# Altium footprint library connectors.PcbLib: 256 footprints (part 5 of 16)
Each footprint in its own frame and in the unit in brackets; x right, y up, seen from the top. Pads: shape width x height; smd on the part's side, far side on the other; paste and mask are expansions set on the pad; w line width, h text height; cw(c..) or ccw(c..) is an arc to the next point about the centre after c.
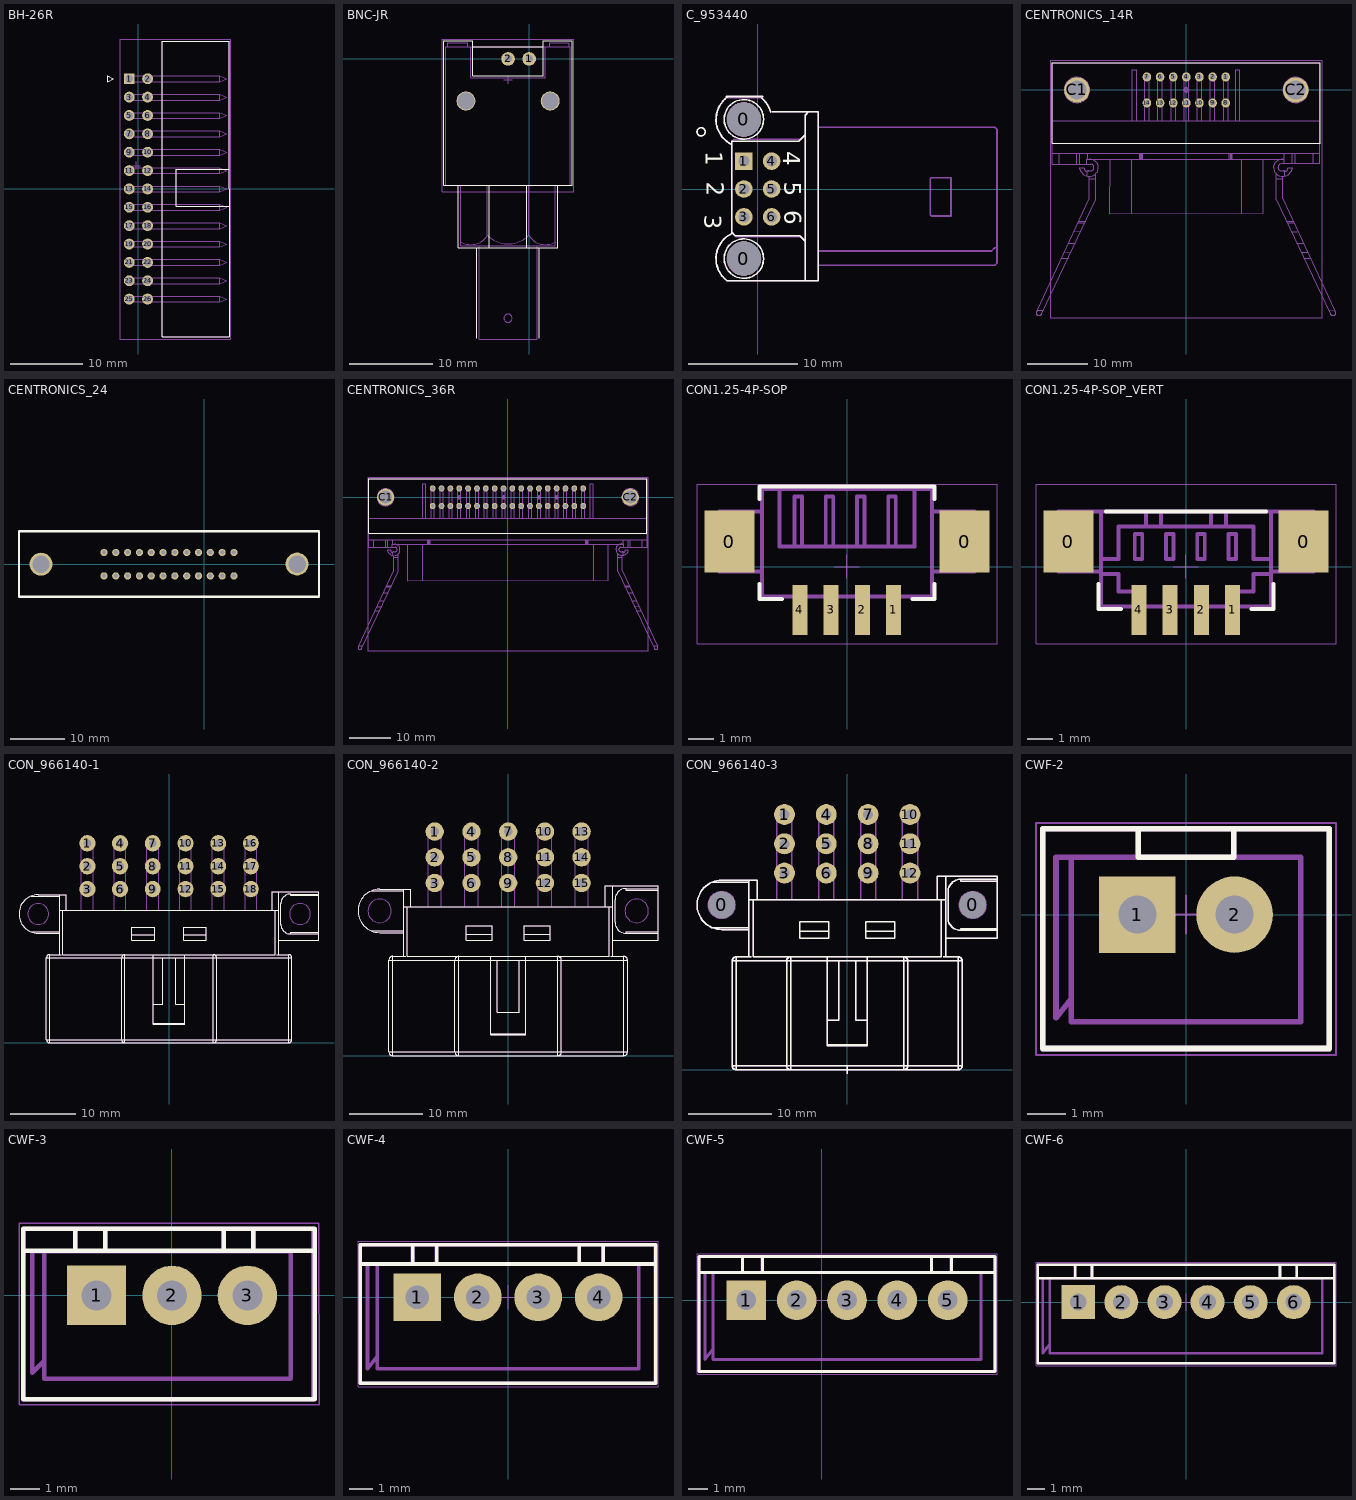
[diagram p4: the footprints below, top view; thin cyan lines are the x and y axes]

## BH-26R [mm] "Вилка 26 контактов на плату угловая, шаг 2,54мм"
height 5.65
pads (26):
  rect 1.5x1.5 hole 1: 1(-1.27,15.24)
  round 1.5 hole 1: 2(1.27,15.24) 3(-1.27,12.7) 4(1.27,12.7) 5(-1.27,10.16) 6(1.27,10.16) 7(-1.27,7.62) 8(1.27,7.62) 9(-1.27,5.08) 10(1.27,5.08) 11(-1.27,2.54) 12(1.27,2.54) 13(-1.27,0) 14(1.27,0) 15(-1.27,-2.54) 16(1.27,-2.54) 17(-1.27,-5.08) 18(1.27,-5.08) 19(-1.27,-7.62) 20(1.27,-7.62) 21(-1.27,-10.16) 22(1.27,-10.16) 23(-1.27,-12.7) 24(1.27,-12.7) 25(-1.27,-15.24) 26(1.27,-15.24)
Top Overlay:
  lines w0.15: 12.53,-2.38 5.23,-2.38 5.23,2.7 12.53,2.7 ; -4.27,14.84 -4.27,15.64 -3.47,15.24 -4.27,14.84 ; 3.33,-20.46 3.33,20.44 12.53,20.44 12.53,-20.46 3.33,-20.46
TopAssy 13:
  lines w0.15: -0.97,-15.64 -0.97,-14.84 ; -0.97,-13.1 -0.97,-12.3 ; -0.97,-10.56 -0.97,-9.76 ; -0.97,-8.02 -0.97,-7.22 ; -0.97,-5.48 -0.97,-4.68 ; -0.97,-2.94 -0.97,-2.14 ; -0.97,-0.4 -0.97,0.4 ; -0.97,2.14 -0.97,2.94 ; -0.97,4.68 -0.97,5.48 ; -0.97,7.22 -0.97,8.02 ; -0.97,9.76 -0.97,10.56 ; -0.97,12.3 -0.97,13.1 ; -0.97,14.84 -0.97,15.64 ; 1.03,-15.64 1.03,-14.84 ; 1.03,-13.1 1.03,-12.3 ; 1.03,-10.56 1.03,-9.76 ; 1.03,-8.02 1.03,-7.22 ; 1.03,-5.48 1.03,-4.68 ; 1.03,-2.94 1.03,-2.14 ; 1.03,-0.4 1.03,0.4 ; 1.03,2.14 1.03,2.94 ; 1.03,4.68 1.03,5.48 ; 1.03,7.22 1.03,8.02 ; 1.03,9.76 1.03,10.56 ; 1.03,12.3 1.03,13.1 ; 1.03,14.84 1.03,15.64 ; 1.63,-15.64 1.63,-14.84 ; 1.63,-13.1 1.63,-12.3 ; 1.63,-10.56 1.63,-9.76 ; 1.63,-8.02 1.63,-7.22 ; 1.63,-5.48 1.63,-4.68 ; 1.63,-2.94 1.63,-2.14 ; 1.63,-0.4 1.63,0.4 ; 1.63,2.14 1.63,2.94 ; 1.63,4.68 1.63,5.48 ; 1.63,7.22 1.63,8.02 ; 1.63,9.76 1.63,10.56 ; 1.63,12.3 1.63,13.1 ; 1.63,14.84 1.63,15.64 ; 12.53,-2.38 5.23,-2.38 5.23,2.7 12.53,2.7 ; 11.23,-15.64 -1.57,-15.64 -1.57,-14.84 11.23,-14.84 ; 11.23,-15.64 12.23,-15.24 11.23,-14.84 ; 11.23,-15.64 11.23,-14.84 ; 11.23,-13.1 -1.57,-13.1 -1.57,-12.3 11.23,-12.3 ; 11.23,-13.1 12.23,-12.7 11.23,-12.3 ; 11.23,-13.1 11.23,-12.3 ; 11.23,-10.56 -1.57,-10.56 -1.57,-9.76 11.23,-9.76 ; 11.23,-10.56 12.23,-10.16 11.23,-9.76 ; 11.23,-10.56 11.23,-9.76 ; 11.23,-8.02 -1.57,-8.02 -1.57,-7.22 11.23,-7.22 ; 11.23,-8.02 12.23,-7.62 11.23,-7.22 ; 11.23,-8.02 11.23,-7.22 ; 11.23,-5.48 -1.57,-5.48 -1.57,-4.68 11.23,-4.68 ; 11.23,-5.48 12.23,-5.08 11.23,-4.68 ; 11.23,-5.48 11.23,-4.68 ; 11.23,-2.94 -1.57,-2.94 -1.57,-2.14 11.23,-2.14 ; 11.23,-2.94 12.23,-2.54 11.23,-2.14 ; 11.23,-2.94 11.23,-2.14 ; 11.23,-0.4 -1.57,-0.4 -1.57,0.4 11.23,0.4 ; 11.23,-0.4 12.23,0 11.23,0.4 ; 11.23,-0.4 11.23,0.4 ; 11.23,2.14 -1.57,2.14 -1.57,2.94 11.23,2.94 ; 11.23,2.14 12.23,2.54 11.23,2.94 ; 11.23,2.14 11.23,2.94 ; 11.23,4.68 -1.57,4.68 -1.57,5.48 11.23,5.48 ; 11.23,4.68 12.23,5.08 11.23,5.48 ; 11.23,4.68 11.23,5.48 ; 11.23,7.22 -1.57,7.22 -1.57,8.02 11.23,8.02 ; 11.23,7.22 12.23,7.62 11.23,8.02 ; 11.23,7.22 11.23,8.02 ; 11.23,9.76 -1.57,9.76 -1.57,10.56 11.23,10.56 ; 11.23,9.76 12.23,10.16 11.23,10.56 ; 11.23,9.76 11.23,10.56 ; 11.23,12.3 -1.57,12.3 -1.57,13.1 11.23,13.1 ; 11.23,12.3 12.23,12.7 11.23,13.1 ; 11.23,12.3 11.23,13.1 ; 11.23,14.84 -1.57,14.84 -1.57,15.64 11.23,15.64 ; 11.23,14.84 12.23,15.24 11.23,15.64 ; 11.23,14.84 11.23,15.64 ; -4.27,14.84 -3.47,15.24 -4.27,15.64 -4.27,14.84 ; -1.87,14.665 -1.87,15.815 -0.67,15.815 -0.67,14.665 -0.695,14.64 -1.845,14.64 -1.87,14.665 ; 3.33,-20.46 12.53,-20.46 12.53,20.44 3.33,20.44 3.33,-20.46
TopCourt 15:
  lines w0.05: -0.77,3.24 0.23,3.24 ; -0.27,2.74 -0.27,3.74 ; -2.57,-20.76 12.73,-20.76 12.73,20.74 -2.57,20.74 -2.57,-20.76
3D body "User Library-DS1013-26R (IDC-26R CONNFLY).step": height 8.9, standoff -3, extent -1.59,-20.41 12.43,20.41

## BNC-JR [mil] "5227677-1 TE Connectivity, BNC,90¦,jack,solder,PCB mount,Au,50ohm"
pads (4):
  round 65 / inner round 57 / far side round 65 hole 35 mask-8: 1(0,0) 2(-100,0)
  round 90 / inner round 79 / far side round 90 hole 79 mask-11: Hole5(100,-200) Hole6(-300,-200)
Top Overlay:
  lines w5.91: -336.22,-600 -336.22,-897.24 136.22,-897.24 136.22,-600 ; -267.32,57.48 67.32,57.48 ; -247.64,-1326.77 -247.64,-897.24 ; -188.58,-897.24 -188.58,-600 ; -11.42,-897.24 -11.42,-600 ; 47.64,-1326.77 47.64,-897.24 ; -405.12,-600 -405.12,87.01 -267.32,87.01 -267.32,-80.31 67.32,-80.31 67.32,87.01 205.12,87.01 205.12,-600 -405.12,-600
TopAssy 13:
  circle w5.91: c-100,-1231.89 r19.68
  circle w5.91: c0,0 r23.62
  circle w5.91: c-100,0 r23.62
  circle w5.91: c100,-200 r41.07
  circle w5.91: c-300,-200 r41.07
  lines w5.91: -385.43,57.48 -385.43,77.17 -290.94,77.17 -290.94,57.48 ; -325.38,-868.33 ccw(c-277.17,-788.98) -198.43,-838.19 ; -325,-600 -325,-887.4 125,-887.4 125,-600 ; -277.17,57.48 -277.17,-90.16 77.17,-90.16 77.17,57.48 ; -237.8,-887.4 -237.8,-1330.32 37.8,-1330.32 37.8,-887.4 ; -198.43,-600 -198.43,-838.19 ; -1.57,-601.97 -1.57,-838.19 ; 96.85,57.48 96.85,77.17 191.34,77.17 191.34,57.48 ; 125.38,-868.33 cw(c77.17,-788.98) -1.57,-838.19 ; -198.43,-838.19 ccw(c-100,-739.76) -1.57,-838.19 ; -395.28,-600 195.28,-600 195.28,57.48 -100,57.48 -395.28,57.48 -395.28,-600
TopCourt 15:
  lines w1.97: -119.69,-100 -80.31,-100 ; -100,-118.7 -100,-81.3 ; -413.39,-629.92 -413.39,94.49 212.6,94.49 212.6,-629.92 -413.39,-629.92
3D body "BNC-JR(5227677-1 TE).stp": height 625.5, standoff -161.5, extent -390.49,-1324.99 190.51,75.01

## C_953440 [mm]
pads (8):
  round 3.1 hole 3.1 unplated: 0(-1.27,-6.35) 0(-1.27,6.35)
  rect 1.6x1.6 hole 1: 1(-1.27,2.54)
  round 1.6 hole 1: 2(-1.27,0) 3(-1.27,-2.54) 4(1.27,2.54) 5(1.27,0) 6(1.27,-2.54)
Top Overlay:
  circle w0.15: c-5.17,5.216 r0.376
  circle w0.15: c-1.27,-6.35 r1.8
  circle w0.15: c-1.27,6.355 r1.8
  lines w0.15: -2.87,8.44 0.43,8.44 ; -2.839,-8.36 -0.747,-8.36 3.438,-8.36 5.53,-8.36 5.53,7.04 1.33,7.04 ; -2.839,-8.348 cw(c-1.27,-6.35) -2.406,-4.078 ; -2.768,8.401 ccw(c-1.27,6.35) -2.362,4.057 -2.362,4.348 3.738,4.348 4.33,4.94 ; -2.37,4.04 -2.37,-3.96 ; -2.27,-4.06 -2.37,-3.96 ; 0.38,8.281 cw(c-1.27,6.35) 1.185,7.002 ; 4.28,-4.71 3.83,-4.26 -2.07,-4.26 -2.37,-3.96 ; 4.33,-8.36 4.33,6.74 4.63,7.04
  text "6" at 2.43,-1.96 h1.52
  text "5" at 2.43,0.64 h1.52
  text "4" at 2.33,3.44 h1.52
  text "2" at -4.67,0.64 h1.52
  text "3" at -4.87,-2.36 h1.52
  text "1" at -4.77,3.44 h1.52
TopAssy 13:
  circle w0.15: c-1.27,6.35 r1.515
  circle w0.15: c-1.27,-6.35 r1.512
  lines w0.15: -2.87,8.34 0.43,8.34 ; -2.839,-8.36 5.53,-8.36 5.53,7.04 1.33,7.04 ; -2.839,-8.348 cw(c-1.27,-6.35) -2.406,-4.078 ; -2.768,8.401 ccw(c-1.27,6.35) -2.362,4.057 -2.362,4.348 -2.17,4.54 3.93,4.54 4.33,4.94 ; -2.37,4.04 -2.37,-3.96 ; -2.27,-4.06 -2.37,-3.96 ; 0.38,8.281 cw(c-1.27,6.35) 1.185,7.002 ; 4.28,-4.71 3.93,-4.36 -1.97,-4.36 -2.37,-3.96 ; 4.33,-8.36 4.33,6.74 4.63,7.04 ; 5.53,-6.96 21.63,-6.96 21.83,-6.76 21.83,5.44 21.63,5.64 5.53,5.64 ; 5.53,-5.66 21.33,-5.66 21.63,-5.36 21.83,-5.36 ; 15.73,-2.36 15.73,0.94 15.83,1.04 17.63,1.04 17.63,-2.46 15.83,-2.46 15.73,-2.36
3D body "c-953440-1-a-3d.stp": height 16.5, standoff -3, extent -3.67,-8.5 22.13,8.3

## CENTRONICS_14R [mm]
height 15.5
pads (16):
  oval 1.4x1.5 hole 0.9: 1(6.48,2.145) 2(4.32,2.145) 3(2.16,2.145) 4(0,2.145) 5(-2.16,2.145) 6(-4.32,2.145) 7(-6.48,2.145) 8(6.48,-2.145) 9(4.32,-2.145) 10(2.16,-2.145) 11(0,-2.145) 12(-2.16,-2.145) 13(-4.32,-2.145) 14(-6.48,-2.145)
  round 4.191 hole 3.175: C1(-18,0) C2(18,0)
Top Overlay:
  lines w0.15: -22.044,-8.756 22.014,-8.756 22.014,4.479 -22.044,4.479 -22.044,-8.756
TopAssy 13:
  drawing of 183 lines, arcs and shapes, not listed
TopCourt 15:
  circle w0.05: c0,0 r0.361
  lines w0.05: -0.5,0 0.5,0 ; 0,-0.5 0,0.5 ; -22.4,-37.5 -22.4,4.9 22.4,4.9 22.4,-37.5 -22.4,-37.5
3D body "centronics_a-57_14fr_kl.stp": height 15.51, standoff -4.75, extent -24.746,-37.171 24.746,4.44

## CENTRONICS_24 [mil]
pads (27):
  round 52 hole 32: 1(212.5,84.5) 2(127.5,84.5) 3(42.5,84.5) 4(-42.5,84.5) 5(-127.5,84.5) 6(-212.5,84.5) 7(-297.5,84.5) 8(-382.5,84.5) 9(-467.5,84.5) 10(-552.5,84.5) 11(-637.5,84.5) 12(-722.5,84.5) 13(212.5,-84.5) 14(127.5,-84.5) 15(42.5,-84.5) 16(-42.5,-84.5) 17(-127.5,-84.5) 18(-212.5,-84.5) 19(-297.5,-84.5) 20(-382.5,-84.5) 21(-467.5,-84.5) 22(-552.5,-84.5) 23(-637.5,-84.5) 24(-722.5,-84.5)
  round 165 hole 125: ""(-1176,0) ""(666.5,1.1) ""(666.8,0.6)
Top Overlay:
  lines w15: -1334,-233.11 -1334,237 823.04,237 ; -1332,-234.58 824.07,-234.58 ; 823.04,235.29 824.47,-232

## CENTRONICS_36R [mm]
height 15.5
pads (38):
  oval 1.4x1.5 hole 0.9: 1(18.36,2.145) 2(16.2,2.145) 3(14.04,2.145) 4(11.88,2.145) 5(9.72,2.145) 6(7.56,2.145) 7(5.4,2.145) 8(3.24,2.145) 9(1.08,2.145) 10(-1.08,2.145) 11(-3.24,2.145) 12(-5.4,2.145) 13(-7.56,2.145) 14(-9.72,2.145) 15(-11.88,2.145) 16(-14.04,2.145) 17(-16.2,2.145) 18(-18.36,2.145) 19(18.36,-2.145) 20(16.2,-2.145) 21(14.04,-2.145) 22(11.88,-2.145) 23(9.72,-2.145) 24(7.56,-2.145) 25(5.4,-2.145) 26(3.24,-2.145) 27(1.08,-2.145) 28(-1.08,-2.145) 29(-3.24,-2.145) 30(-5.4,-2.145) 31(-7.56,-2.145) 32(-9.72,-2.145) 33(-11.88,-2.145) 34(-14.04,-2.145) 35(-16.2,-2.145) 36(-18.36,-2.145)
  round 4.191 hole 3.175: C1(-29.85,0) C2(29.85,0)
Top Overlay:
  lines w0.15: -33.915,-8.756 -33.915,4.479 33.91,4.479 33.91,-8.756 -33.915,-8.756
TopAssy 13:
  drawing of 251 lines, arcs and shapes, not listed
TopCourt 15:
  circle w0.05: c-11.848,-0.029 r0.361
  circle w0.05: c11.884,-0.003 r0.361
  circle w0.05: c-1.048,-0.029 r0.361
  circle w0.05: c7.592,-0.029 r0.361
  lines w0.05: -12.348,-0.029 -11.348,-0.029 ; -11.848,-0.529 -11.848,0.471 ; -1.548,-0.029 -0.548,-0.029 ; -1.048,-0.529 -1.048,0.471 ; 7.092,-0.029 8.092,-0.029 ; 7.592,-0.529 7.592,0.471 ; 11.384,-0.003 12.384,-0.003 ; 11.884,-0.503 11.884,0.497 ; 34.284,4.897 34.284,-37.503 -34.248,-37.499 -34.248,4.871 34.284,4.907
3D body "centronics_a-57_36fr_kl.stp": height 15.51, standoff -4.75, extent -36.656,-37.171 36.656,4.44

## CON1.25-4P-SOP [mm] "Molex 53261-0471 -1.25mm Pitch PicoBlade Header, Surface Mount, Right Angle, 4 Circuits"
pads (6):
  rect 2x2.5 smd: 0(-4.7,1) 0(4.7,1)
  rect 0.6x2 smd: 1(1.862,-1.731) 2(0.612,-1.731) 3(-0.638,-1.731) 4(-1.888,-1.731)
Top Overlay:
  lines w0.15: -3.5,-0.7 -3.5,-1.3 -2.588,-1.3 ; -3.5,2.7 -3.5,3.2 3.5,3.2 3.5,2.7 ; 2.612,-1.3 3.5,-1.3 3.5,-0.7
TopAssy 13:
  lines w0.15: -3.4,-0.2 -5.1,-0.2 -5.1,2.2 -3.4,2.2 ; -2.8,3.1 -2.7,3.1 -2.7,0.8 2.7,0.8 2.7,3.1 ; -2.1,0.8 -2.1,2.8 -1.8,2.8 -1.8,0.8 ; -0.85,0.8 -0.85,2.8 -0.55,2.8 -0.55,0.8 ; 0.4,0.8 0.4,2.8 0.7,2.8 0.7,0.8 ; 1.65,0.8 1.65,2.8 1.95,2.8 1.95,0.8 ; 3.4,-0.2 5.1,-0.2 5.1,2.2 3.4,2.2 ; -3.4,-1.2 -3.4,3.1 3.4,3.1 3.4,-1.2 -3.4,-1.2
TopCourt 15:
  lines w0.05: -0.5,0 0.5,0 ; 0,-0.475 0,0.475 ; -6,-3.1 6,-3.1 6,3.3 -6,3.3 -6,-3.1
3D body "532610471.stp": height 3.41, standoff 0.01, extent -5.075,-2.125 5.075,3.075

## CON1.25-4P-SOP_VERT [mm] "Molex 53398-0471    1.25mm Pitch PicoBlade Header, Surface Mount, Vertical, 4 Circuits"
pads (6):
  rect 2x2.5 smd: 0(-4.7,1) 0(4.7,1)
  rect 0.6x2 smd: 1(1.862,-1.731) 2(0.612,-1.731) 3(-0.638,-1.731) 4(-1.888,-1.731)
Top Overlay:
  lines w0.15: -3.5,-0.7 -3.5,-1.7 -2.588,-1.7 ; -3.2,2.2 3.2,2.2 ; 2.612,-1.7 3.5,-1.7 3.5,-0.7
TopAssy 13:
  lines w0.15: -3.4,-0.3 -2.7,-0.3 -2.7,-1 -2,-1 -2,-1.6 ; -3.4,-0.2 -5.1,-0.2 -5.1,2.2 -3.4,2.2 ; -3.4,0.3 -2.7,0.3 -2.7,1.6 2.7,1.6 2.7,0.3 3.4,0.3 ; -2.053,-1.6 -2.053,-2.118 -1.753,-2.118 -1.753,-1.6 ; -1.6,1.6 -1.6,2.2 ; -1,1.6 -1,2.2 ; -0.803,-1.6 -0.803,-2.118 -0.503,-2.118 -0.503,-1.6 ; 0.447,-1.6 0.447,-2.118 0.747,-2.118 0.747,-1.6 ; 1,1.6 1,2.2 ; 1.6,1.6 1.6,2.2 ; 1.697,-1.6 1.697,-2.118 1.997,-2.118 1.997,-1.6 ; 2,-1.6 2,-1 2.7,-1 2.7,-0.3 3.4,-0.3 ; 3.4,-0.2 5.1,-0.2 5.1,2.2 3.4,2.2 ; -3.4,2.2 -3.4,-1.6 3.4,-1.6 3.4,2.2 ; -3.4,2.2 3.4,2.2 ; -2.05,0.3 -2.05,1.3 -1.75,1.3 -1.75,0.3 -2.05,0.3 ; -0.8,0.3 -0.8,1.3 -0.5,1.3 -0.5,0.3 -0.8,0.3 ; 0.45,0.3 0.45,1.3 0.75,1.3 0.75,0.3 0.45,0.3 ; 1.7,0.3 1.7,1.3 2,1.3 2,0.3 1.7,0.3
TopCourt 15:
  lines w0.05: -0.5,0 0.5,0 ; 0,-0.475 0,0.475 ; -6,-3.1 -6,3.3 6,3.3 6,-3.1 -6,-3.1
3D body "533980471.stp": height 4.71, standoff -0.04, extent -5.075,-2.1 5.075,2.1

## CON_966140-1 [mm] "MOLEX_966140-1  18P"
height 25.7
pads (18):
  round 2.5 hole 1.2: 1(-12.5,30.5) 2(-12.5,27) 3(-12.5,23.5) 4(-7.5,30.5) 5(-7.5,27) 6(-7.5,23.5)
  oval 2.4x2.5 hole 1.2: 7(-2.5,30.5) 8(-2.5,27) 9(-2.5,23.5) 10(2.5,30.5) 11(2.5,27) 12(2.5,23.5) 13(7.5,30.5) 14(7.5,27) 15(7.5,23.5) 16(12.5,30.5) 17(12.5,27) 18(12.5,23.5)
Top Overlay:
  lines w0.15: -21.115,16.969 -16.75,16.969 ; -21.115,22.431 -16.75,22.431 ; -16.75,13.5 -16.75,22.65 ; -16.75,16.75 -20,16.75 cw(c-20,19.7) -20,22.65 -15.75,22.65 -15.75,20.3 ; -16.75,20.3 16.75,20.3 ; -16.468,13.5 -18.25,13.5 ; -16.25,20.3 -16.25,13.497 -6.8,13.497 ; -5.7,16.545 -2.2,16.545 ; -2.4,3 2.4,3 ; -2.4,5.9 -1,5.9 -1,13 ; -2.4,13.5 -2.4,2.869 2.4,2.869 2.4,13.5 ; 1,13 1,5.9 2.4,5.9 ; 2.2,16.545 5.7,16.545 ; 6.8,13.497 16.25,13.497 16.25,20.3 ; 15.75,20.3 15.75,23.1 22.9,23.1 22.9,15.7 16.75,15.7 ; 16.468,13.5 18.25,13.5 ; 16.75,13.5 16.75,23.1 ; 22.9,16.65 18.55,16.65 ; 22.9,16.869 18.55,16.869 18.55,16.65 ; 22.9,22.531 18.55,22.531 18.55,22.75 ; 22.9,22.75 18.55,22.75 ; -18.75,0.5 ccw(c-18.25,0.5) -18.25,0 ; -18.75,0.5 18.75,0.5 ; -18.75,0.5 -18.75,13 ; -18.75,13 cw(c-18.25,13) -18.25,13.5 ; -18.75,13 18.75,13 ; -18.25,0 18.25,0 ; -18.25,0 -18.25,13.5 ; -6.75,13.5 ccw(c-6.75,13) -7.25,13 -7.25,0.5 ccw(c-6.75,0.5) -6.75,0 -6.75,13.5 ; -6.75,13.5 6.75,13.5 ; 6.75,13.5 cw(c6.75,13) 7.25,13 7.25,0.5 cw(c6.75,0.5) 6.75,0 6.75,13.5 ; 18.25,0 ccw(c18.25,0.5) 18.75,0.5 ; 18.25,0 18.25,13.5 ; 18.25,13.5 cw(c18.25,13) 18.75,13 ; 18.55,16.65 cw(c18.553,18.153) 17.05,18.156 17.05,21.244 cw(c18.553,21.247) 18.55,22.75 ; 18.75,0.5 18.75,13 ; -5.7,15.7 -2.2,15.7 -2.2,17.7 -5.7,17.7 -5.7,15.7 ; 2.2,15.7 2.2,17.7 5.7,17.7 5.7,15.7 2.2,15.7
TopAssy 13:
  circle w0.127: c-20,19.7 r1.6
  circle w0.127: c20,19.7 r1.6
  lines w0.15: -21.115,16.969 -16.75,16.969 ; -21.115,22.431 -16.75,22.431 ; -16.75,13.5 -16.75,22.65 ; -16.75,16.75 -20,16.75 cw(c-20,19.7) -20,22.65 -15.75,22.65 -15.75,20.3 ; -16.75,20.3 16.75,20.3 ; -16.468,13.5 -18.25,13.5 ; -16.25,20.3 -16.25,13.497 -6.8,13.497 ; -13.4,20.3 -13.4,30.9 ; -11.6,20.3 -11.6,30.9 ; -8.4,20.3 -8.4,30.9 ; -6.6,20.3 -6.6,30.9 ; -5.7,16.545 -2.2,16.545 ; -3.4,20.3 -3.4,30.9 ; -2.4,3 2.4,3 ; -2.4,5.9 -1,5.9 -1,13 ; -2.4,13.5 -2.4,2.869 2.4,2.869 2.4,13.5 ; -1.6,20.3 -1.6,30.9 ; 1,13 1,5.9 2.4,5.9 ; 1.6,20.3 1.6,30.9 ; 2.2,16.545 5.7,16.545 ; 3.4,20.3 3.4,30.9 ; 6.6,20.3 6.6,30.9 ; 6.8,13.497 16.25,13.497 16.25,20.3 ; 8.4,20.3 8.4,30.9 ; 11.6,20.3 11.6,30.9 ; 13.4,20.3 13.4,30.9 ; 15.75,20.3 15.75,23.1 22.9,23.1 22.9,15.7 16.75,15.7 ; 16.468,13.5 18.25,13.5 ; 16.75,13.5 16.75,23.1 ; 22.9,16.65 18.55,16.65 ; 22.9,16.869 18.55,16.869 18.55,16.65 ; 22.9,22.531 18.55,22.531 18.55,22.75 ; 22.9,22.75 18.55,22.75 ; -18.75,0.5 ccw(c-18.25,0.5) -18.25,0 ; -18.75,0.5 -18.75,13 ; -18.75,0.5 18.75,0.5 ; -18.75,13 cw(c-18.25,13) -18.25,13.5 ; -18.75,13 18.75,13 ; -18.25,0 -18.25,13.5 ; -18.25,0 18.25,0 ; -13.4,30.9 -11.6,30.9 ; -13.4,30.9 -11.6,30.9 ; -8.4,30.9 -6.6,30.9 ; -8.4,30.9 -6.6,30.9 ; -6.75,13.5 ccw(c-6.75,13) -7.25,13 -7.25,0.5 ccw(c-6.75,0.5) -6.75,0 -6.75,13.5 ; -6.75,13.5 6.75,13.5 ; -3.4,30.9 -1.6,30.9 ; -3.4,30.9 -1.6,30.9 ; 1.6,30.9 3.4,30.9 ; 1.6,30.9 3.4,30.9 ; 6.6,30.9 8.4,30.9 ; 6.6,30.9 8.4,30.9 ; 6.75,13.5 cw(c6.75,13) 7.25,13 7.25,0.5 cw(c6.75,0.5) 6.75,0 6.75,13.5 ; 11.6,30.9 13.4,30.9 ; 11.6,30.9 13.4,30.9 ; 18.25,0 ccw(c18.25,0.5) 18.75,0.5 ; 18.25,0 18.25,13.5 ; 18.25,13.5 cw(c18.25,13) 18.75,13 ; 18.55,16.65 cw(c18.553,18.153) 17.05,18.156 17.05,21.244 cw(c18.553,21.247) 18.55,22.75 ; 18.75,0.5 18.75,13 ; -5.7,15.7 -5.7,17.7 -2.2,17.7 -2.2,15.7 -5.7,15.7 ; 2.2,15.7 2.2,17.7 5.7,17.7 5.7,15.7 2.2,15.7
3D body "Connector_966140-1.stp": height 25.71, standoff -2.99, extent -22.95,0 22.9,30.9

## CON_966140-2 [mm] "MOLEX_966140-2  15P"
height 25.7
pads (15):
  round 2.5 hole 1.2: 1(-10,30.5) 2(-10,27) 3(-10,23.5) 4(-5,30.5) 5(-5,27) 6(-5,23.5) 7(0,30.5) 8(0,27) 9(0,23.5) 10(5,30.5) 11(5,27) 12(5,23.5) 13(10,30.5) 14(10,27) 15(10,23.5)
Top Overlay:
  lines w0.15: -18.615,16.969 -14.25,16.969 ; -18.615,22.431 -14.25,22.431 ; -14.25,13.5 -14.25,22.65 ; -14.25,16.75 -17.5,16.75 cw(c-17.5,19.7) -17.5,22.65 -13.25,22.65 -13.25,20.3 ; -14.25,20.3 14.25,20.3 ; -13.968,13.5 -15.75,13.5 ; -13.75,20.3 -13.75,13.497 -6.8,13.497 ; -5.7,16.545 -2.2,16.545 ; -2.4,3 2.4,3 ; -2.4,13.5 -2.4,2.869 2.4,2.869 2.4,13.5 ; -1.5,13 -1.5,5.9 1.5,5.9 1.5,13 ; 2.2,16.545 5.7,16.545 ; 6.8,13.497 13.75,13.497 13.75,20.3 ; 13.25,20.3 13.25,23.1 20.4,23.1 20.4,15.7 14.25,15.7 ; 13.968,13.5 15.75,13.5 ; 14.25,13.5 14.25,23.1 ; 20.4,16.65 16.05,16.65 ; 20.4,16.869 16.05,16.869 16.05,16.65 ; 20.4,22.531 16.05,22.531 16.05,22.75 ; 20.4,22.75 16.05,22.75 ; -16.25,0.5 ccw(c-15.75,0.5) -15.75,0 ; -16.25,0.5 16.25,0.5 ; -16.25,0.5 -16.25,13 ; -16.25,13 cw(c-15.75,13) -15.75,13.5 ; -16.25,13 16.25,13 ; -15.75,0 15.75,0 ; -15.75,0 -15.75,13.5 ; -6.75,13.5 ccw(c-6.75,13) -7.25,13 -7.25,0.5 ccw(c-6.75,0.5) -6.75,0 -6.75,13.5 ; -6.75,13.5 6.75,13.5 ; 6.75,13.5 cw(c6.75,13) 7.25,13 7.25,0.5 cw(c6.75,0.5) 6.75,0 6.75,13.5 ; 15.75,0 ccw(c15.75,0.5) 16.25,0.5 ; 15.75,0 15.75,13.5 ; 15.75,13.5 cw(c15.75,13) 16.25,13 ; 16.05,16.65 cw(c16.053,18.153) 14.55,18.156 14.55,21.244 cw(c16.053,21.247) 16.05,22.75 ; 16.25,0.5 16.25,13 ; -5.7,15.7 -2.2,15.7 -2.2,17.7 -5.7,17.7 -5.7,15.7 ; 2.2,15.7 2.2,17.7 5.7,17.7 5.7,15.7 2.2,15.7
TopAssy 13:
  circle w0.127: c17.5,19.7 r1.6
  circle w0.127: c-17.5,19.7 r1.6
  lines w0.15: -18.615,16.969 -14.25,16.969 ; -18.615,22.431 -14.25,22.431 ; -14.25,13.5 -14.25,22.65 ; -14.25,16.75 -17.5,16.75 cw(c-17.5,19.7) -17.5,22.65 -13.25,22.65 -13.25,20.3 ; -14.25,20.3 14.25,20.3 ; -13.968,13.5 -15.75,13.5 ; -13.75,20.3 -13.75,13.497 -6.8,13.497 ; -10.9,20.3 -10.9,30.9 ; -9.1,20.3 -9.1,30.9 ; -5.9,20.3 -5.9,30.9 ; -5.7,16.545 -2.2,16.545 ; -4.1,20.3 -4.1,30.9 ; -2.4,3 2.4,3 ; -2.4,13.5 -2.4,2.869 2.4,2.869 2.4,13.5 ; -1.5,13 -1.5,5.9 1.5,5.9 1.5,13 ; -0.9,20.3 -0.9,30.9 ; 0.9,20.3 0.9,30.9 ; 2.2,16.545 5.7,16.545 ; 4.1,20.3 4.1,30.9 ; 5.9,20.3 5.9,30.9 ; 6.8,13.497 13.75,13.497 13.75,20.3 ; 9.1,20.3 9.1,30.9 ; 10.9,20.3 10.9,30.9 ; 13.25,20.3 13.25,23.1 20.4,23.1 20.4,15.7 14.25,15.7 ; 13.968,13.5 15.75,13.5 ; 14.25,13.5 14.25,23.1 ; 20.4,16.65 16.05,16.65 ; 20.4,16.869 16.05,16.869 16.05,16.65 ; 20.4,22.531 16.05,22.531 16.05,22.75 ; 20.4,22.75 16.05,22.75 ; -16.25,0.5 ccw(c-15.75,0.5) -15.75,0 ; -16.25,0.5 -16.25,13 ; -16.25,0.5 16.25,0.5 ; -16.25,13 cw(c-15.75,13) -15.75,13.5 ; -16.25,13 16.25,13 ; -15.75,0 -15.75,13.5 ; -15.75,0 15.75,0 ; -10.9,30.9 -9.1,30.9 ; -10.9,30.9 -9.1,30.9 ; -6.75,13.5 ccw(c-6.75,13) -7.25,13 -7.25,0.5 ccw(c-6.75,0.5) -6.75,0 -6.75,13.5 ; -6.75,13.5 6.75,13.5 ; -5.9,30.9 -4.1,30.9 ; -5.9,30.9 -4.1,30.9 ; -0.9,30.9 0.9,30.9 ; -0.9,30.9 0.9,30.9 ; 4.1,30.9 5.9,30.9 ; 4.1,30.9 5.9,30.9 ; 6.75,13.5 cw(c6.75,13) 7.25,13 7.25,0.5 cw(c6.75,0.5) 6.75,0 6.75,13.5 ; 9.1,30.9 10.9,30.9 ; 9.1,30.9 10.9,30.9 ; 15.75,0 ccw(c15.75,0.5) 16.25,0.5 ; 15.75,0 15.75,13.5 ; 15.75,13.5 cw(c15.75,13) 16.25,13 ; 16.05,16.65 cw(c16.053,18.153) 14.55,18.156 14.55,21.244 cw(c16.053,21.247) 16.05,22.75 ; 16.25,0.5 16.25,13 ; -5.7,15.7 -5.7,17.7 -2.2,17.7 -2.2,15.7 -5.7,15.7 ; 2.2,15.7 2.2,17.7 5.7,17.7 5.7,15.7 2.2,15.7
3D body "Connector_966140-2.stp": height 25.71, standoff -2.99, extent -20.45,0 20.4,30.9

## CON_966140-3 [mm] "MOLEX_966140-3 12P"
height 25.7
pads (14):
  round 3.2 hole 3.2 unplated: 0(-15,19.7) 0(15,19.7)
  round 2.5 hole 1.2: 1(-7.5,30.5) 2(-7.5,27) 3(-7.5,23.5) 4(-2.5,30.5) 5(-2.5,27) 6(-2.5,23.5) 7(2.5,30.5) 8(2.5,27) 9(2.5,23.5) 10(7.5,30.5) 11(7.5,27) 12(7.5,23.5)
Top Overlay:
  lines w0.15: -16.115,16.969 -11.75,16.969 ; -16.115,22.431 -11.75,22.431 ; -11.75,13.5 -11.75,22.65 ; -11.75,16.75 -15,16.75 cw(c-15,19.7) -15,22.65 -10.75,22.65 -10.75,20.3 ; -11.75,20.3 11.75,20.3 ; -11.468,13.5 -13.25,13.5 ; -11.25,20.3 -11.25,13.497 -6.8,13.497 ; -5.7,16.545 -2.2,16.545 ; -2.4,3 2.4,3 ; -2.4,5.9 -1,5.9 -1,13 ; -2.4,13.5 -2.4,2.869 2.4,2.869 2.4,13.5 ; 0,-0.5 0,0 0,0.5 ; 1,13 1,5.9 2.4,5.9 ; 2.2,16.545 5.7,16.545 ; 6.8,13.497 11.25,13.497 11.25,20.3 ; 10.75,20.3 10.75,23.1 17.9,23.1 17.9,15.7 11.75,15.7 ; 11.468,13.5 13.25,13.5 ; 11.75,13.5 11.75,23.1 ; 17.9,16.65 13.55,16.65 ; 17.9,16.869 13.55,16.869 13.55,16.65 ; 17.9,22.531 13.55,22.531 13.55,22.75 ; 17.9,22.75 13.55,22.75 ; -13.75,0.5 ccw(c-13.25,0.5) -13.25,0 ; -13.75,0.5 13.75,0.5 ; -13.75,0.5 -13.75,13 ; -13.75,13 cw(c-13.25,13) -13.25,13.5 ; -13.75,13 13.75,13 ; -13.25,0 13.25,0 ; -13.25,0 -13.25,13.5 ; -6.75,13.5 ccw(c-6.75,13) -7.25,13 -7.25,0.5 ccw(c-6.75,0.5) -6.75,0 -6.75,13.5 ; -6.75,13.5 6.75,13.5 ; 6.75,13.5 cw(c6.75,13) 7.25,13 7.25,0.5 cw(c6.75,0.5) 6.75,0 6.75,13.5 ; 13.25,0 ccw(c13.25,0.5) 13.75,0.5 ; 13.25,0 13.25,13.5 ; 13.25,13.5 cw(c13.25,13) 13.75,13 ; 13.55,16.65 cw(c13.553,18.153) 12.05,18.156 12.05,21.244 cw(c13.553,21.247) 13.55,22.75 ; 13.75,0.5 13.75,13 ; -5.7,15.7 -2.2,15.7 -2.2,17.7 -5.7,17.7 -5.7,15.7 ; 2.2,15.7 2.2,17.7 5.7,17.7 5.7,15.7 2.2,15.7
TopAssy 13:
  circle w0.15: c-15,19.7 r1.6
  circle w0.15: c15,19.7 r1.6
  lines w0.15: -16.115,16.969 -11.75,16.969 ; -16.115,22.431 -11.75,22.431 ; -11.75,13.5 -11.75,22.65 ; -11.75,16.75 -15,16.75 cw(c-15,19.7) -15,22.65 -10.75,22.65 -10.75,20.3 ; -11.75,20.3 11.75,20.3 ; -11.468,13.5 -13.25,13.5 ; -11.25,20.3 -11.25,13.497 -6.8,13.497 ; -8.4,20.3 -8.4,30.9 ; -6.6,20.3 -6.6,30.9 ; -3.4,20.3 -3.4,30.9 ; -2.4,3 2.4,3 ; -2.4,5.9 -1,5.9 -1,13 ; -2.4,13.5 -2.4,2.869 2.4,2.869 2.4,13.5 ; -1.6,20.3 -1.6,30.9 ; 0,-0.5 0,0 0,0.5 ; 1,13 1,5.9 2.4,5.9 ; 1.6,20.3 1.6,30.9 ; 3.4,20.3 3.4,30.9 ; 6.6,20.3 6.6,30.9 ; 6.8,13.497 11.25,13.497 11.25,20.3 ; 8.4,20.3 8.4,30.9 ; 10.75,20.3 10.75,23.1 17.9,23.1 17.9,15.7 11.75,15.7 ; 11.468,13.5 13.25,13.5 ; 11.75,13.5 11.75,23.1 ; 17.9,16.65 13.55,16.65 ; 17.9,16.869 13.55,16.869 13.55,16.65 ; 17.9,22.531 13.55,22.531 13.55,22.75 ; 17.9,22.75 13.55,22.75 ; -13.75,0.5 ccw(c-13.25,0.5) -13.25,0 ; -13.75,0.5 13.75,0.5 ; -13.75,0.5 -13.75,13 ; -13.75,13 cw(c-13.25,13) -13.25,13.5 ; -13.75,13 13.75,13 ; -13.25,0 13.25,0 ; -13.25,0 -13.25,13.5 ; -8.4,30.9 -6.6,30.9 ; -8.4,30.9 -6.6,30.9 ; -6.75,13.5 ccw(c-6.75,13) -7.25,13 -7.25,0.5 ccw(c-6.75,0.5) -6.75,0 -6.75,13.5 ; -6.75,13.5 6.75,13.5 ; -3.4,30.9 -1.6,30.9 ; -3.4,30.9 -1.6,30.9 ; 1.6,30.9 3.4,30.9 ; 1.6,30.9 3.4,30.9 ; 6.6,30.9 8.4,30.9 ; 6.6,30.9 8.4,30.9 ; 6.75,13.5 cw(c6.75,13) 7.25,13 7.25,0.5 cw(c6.75,0.5) 6.75,0 6.75,13.5 ; 13.25,0 ccw(c13.25,0.5) 13.75,0.5 ; 13.25,0 13.25,13.5 ; 13.25,13.5 cw(c13.25,13) 13.75,13 ; 13.55,16.65 cw(c13.553,18.153) 12.05,18.156 12.05,21.244 cw(c13.553,21.247) 13.55,22.75 ; 13.75,0.5 13.75,13
3D body "Connector_966140-3.stp": height 25.71, standoff -2.99, extent -17.95,0 17.9,30.9

## CWF-2 [mm]
pads (2):
  rect 2x2 hole 1: 1(-1.27,0)
  round 2 hole 1: 2(1.27,0)
Top Overlay:
  lines w0.15: -1.25,2.25 -1.25,1.5 1.25,1.5 1.25,2.25 ; -3.75,-3.5 -3.75,2.25 3.75,2.25 3.75,-3.5 -3.75,-3.5
  text "." at -2.85,2.625 h1.52
TopAssy 13:
  lines w0.15: -3,-2.2 -3.4,-2.7 -3.4,1.5 -3,1.5 ; -1.25,2.25 -1.25,1.5 ; 1.25,2.25 1.25,1.5 ; -3,1.5 -1.25,1.5 ; -3,1.5 -3,-2.8 0,-2.8 3,-2.8 3,1.5 1.25,1.5 ; -1.25,1.5 1.25,1.5 ; -3.75,-3.5 -3.75,2.25 3.75,2.25 3.75,-3.5 -3.75,-3.5
TopCourt 15:
  lines w0.05: -0.5,0 0.5,0 ; 0,-0.5 0,0.5 ; -3.925,-3.675 -3.925,2.4 3.925,2.4 3.925,-3.675 -3.925,-3.675
3D body "User Library-CWF-2.step": height 7.05, standoff -3.45, extent -3.75,-3.55 3.75,2.2

## CWF-3 [mm] "Разъем питания"
height 11.4
pads (3):
  rect 2x2 hole 1: 1(-2.54,0)
  round 2 hole 1: 2(0,0) 3(2.54,0)
Top Overlay:
  lines w0.15: -5,1.499 4.8,1.5 ; -3.25,1.5 -3.25,2.25 ; -2.25,1.5 -2.25,2.25 ; 1.75,1.5 1.75,2.25 ; 2.73,1.5 2.73,2.25 ; -5,-3.5 -5,2.25 4.8,2.25 4.8,-3.5 -5,-3.5
  text "." at -4.2,2.6 h1.52
TopAssy 13:
  lines w0.15: -4.4,1.482 4,1.482 4,-2.8 -4.3,-2.8 -4.3,1.482 -4.7,1.482 -4.7,-2.6 -4.3,-2.2 ; -3.25,1.5 -3.25,2.25 ; -2.25,1.5 -2.25,2.25 ; 1.75,1.5 1.75,2.25 ; 2.75,1.5 2.75,2.25 ; -5,-3.5 -5,2.25 4.75,2.25 4.75,-3.5 -5,-3.5
TopCourt 15:
  lines w0.05: -0.5,0 0.5,0 ; 0,-0.5 0,0.5 ; -5.15,-3.675 4.95,-3.675 4.95,2.425 -5.15,2.425 -5.15,-3.675
3D body "User Library-CWF-3.step": height 7.05, standoff -3.45, extent -5.1,-3.55 4.9,2.2

## CWF-4 [mm]
pads (4):
  rect 2x2 hole 1: 1(-3.81,0)
  round 2 hole 1: 2(-1.27,0) 3(1.27,0) 4(3.81,0)
Top Overlay:
  lines w0.15: -6.2,1.4 6.2,1.4 ; -4,1.5 -4,2.2 ; -3,1.5 -3,2.2 ; 3,1.5 3,2.2 ; 4,1.5 4,2.2 ; -6.2,-3.6 -6.2,2.2 6.2,2.2 6.2,-3.6 -6.2,-3.6
  text "." at -5.125,2.525 h1.52
TopAssy 13:
  lines w0.15: -5.5,-2.5 -5.9,-3 -5.9,1.4 -5.5,1.4 ; -4.01,1.5 -4.01,2.2 ; -3.01,1.5 -3.01,2.2 ; 2.99,1.5 2.99,2.2 ; 3.99,1.5 3.99,2.2 ; -5.5,1.4 -5.5,-3 5.5,-3 5.5,1.4 -5.5,1.4 ; -6.21,-3.6 -6.21,2.2 6.19,2.2 6.19,-3.6 -6.21,-3.6
TopCourt 15:
  lines w0.05: -0.5,0 0.5,0 ; 0,-0.5 0,0.5 ; -6.3,-3.75 6.3,-3.75 6.3,2.35 -6.3,2.35 -6.3,-3.75
3D body "User Library-CWF-4.step": height 7.05, standoff -3.45, extent -6.21,-3.55 6.19,2.2

## CWF-5 [mm]
pads (5):
  rect 2x2 hole 1: 1(-3.81,0)
  round 2 hole 1: 2(-1.27,0) 3(1.27,0) 4(3.81,0) 5(6.35,0)
Top Overlay:
  lines w0.15: -6.2,1.4 8.73,1.4 ; -4,1.5 -4,2.2 ; -3,1.5 -3,2.2 ; 5.54,1.5 5.54,2.2 ; 6.54,1.5 6.54,2.2 ; 8.73,-3.6 -6.2,-3.6 -6.2,2.2 8.73,2.2 ; 8.74,-3.6 8.74,2.2
  text "." at -5.125,2.525 h1.52
TopAssy 13:
  lines w0.15: -5.5,-2.5 -5.9,-3 -5.9,1.4 -5.5,1.4 ; -4.01,1.5 -4.01,2.2 ; -3.01,1.5 -3.01,2.2 ; 5.53,1.5 5.53,2.2 ; 6.53,1.5 6.53,2.2 ; -5.5,1.4 -5.5,-3 8.04,-3 8.04,1.4 -5.5,1.4 ; -6.21,-3.6 -6.21,2.2 8.73,2.2 8.73,-3.6 -6.21,-3.6
TopCourt 15:
  lines w0.05: -0.5,0 0.5,0 ; 0,-0.5 0,0.5 ; -6.3,-3.75 8.84,-3.75 8.84,2.35 -6.3,2.35 -6.3,-3.75
3D body "User Library-DS1069-5 CWF-5.step": height 7.05, standoff -3.45, extent -6.248,-3.551 8.752,2.199

## CWF-6 [mm]
pads (6):
  rect 2x2 hole 1: 1(-6.35,0)
  round 2 hole 1: 2(-3.81,0) 3(-1.27,0) 4(1.27,0) 5(3.81,0) 6(6.35,0)
Top Overlay:
  lines w0.15: -8.74,1.4 8.73,1.4 ; -6.54,1.5 -6.54,2.2 ; -5.54,1.5 -5.54,2.2 ; 5.54,1.5 5.54,2.2 ; 6.54,1.5 6.54,2.2 ; 8.73,-3.6 -8.74,-3.6 -8.74,2.2 8.73,2.2 ; 8.74,-3.6 8.74,2.2
  text "." at -7.665,2.525 h1.52
TopAssy 13:
  lines w0.15: -8.04,-2.5 -8.44,-3 -8.44,1.4 -8.04,1.4 ; -6.55,1.5 -6.55,2.2 ; -5.55,1.5 -5.55,2.2 ; 5.53,1.5 5.53,2.2 ; 6.53,1.5 6.53,2.2 ; -8.04,1.4 8.04,1.4 8.04,-3 -8.04,-3 -8.04,1.4 ; -8.75,-3.6 8.73,-3.6 8.73,2.2 -8.75,2.2 -8.75,-3.6
TopCourt 15:
  lines w0.05: -0.5,0 0.5,0 ; 0,-0.5 0,0.5 ; -8.84,-3.75 -8.84,2.35 8.84,2.35 8.84,-3.75 -8.84,-3.75
3D body "User Library-CWF-6.step": height 7.05, standoff -3.45, extent -8.755,-3.55 8.745,2.2